# Altium footprint library Connectors.PcbLib: 135 footprints (part 2 of 9)
Each footprint in its own frame and in the unit in brackets; x right, y up, seen from the top. Pads: shape width x height; smd on the part's side, far side on the other; paste and mask are expansions set on the pad; w line width, h text height; cw(c..) or ccw(c..) is an arc to the next point about the centre after c.
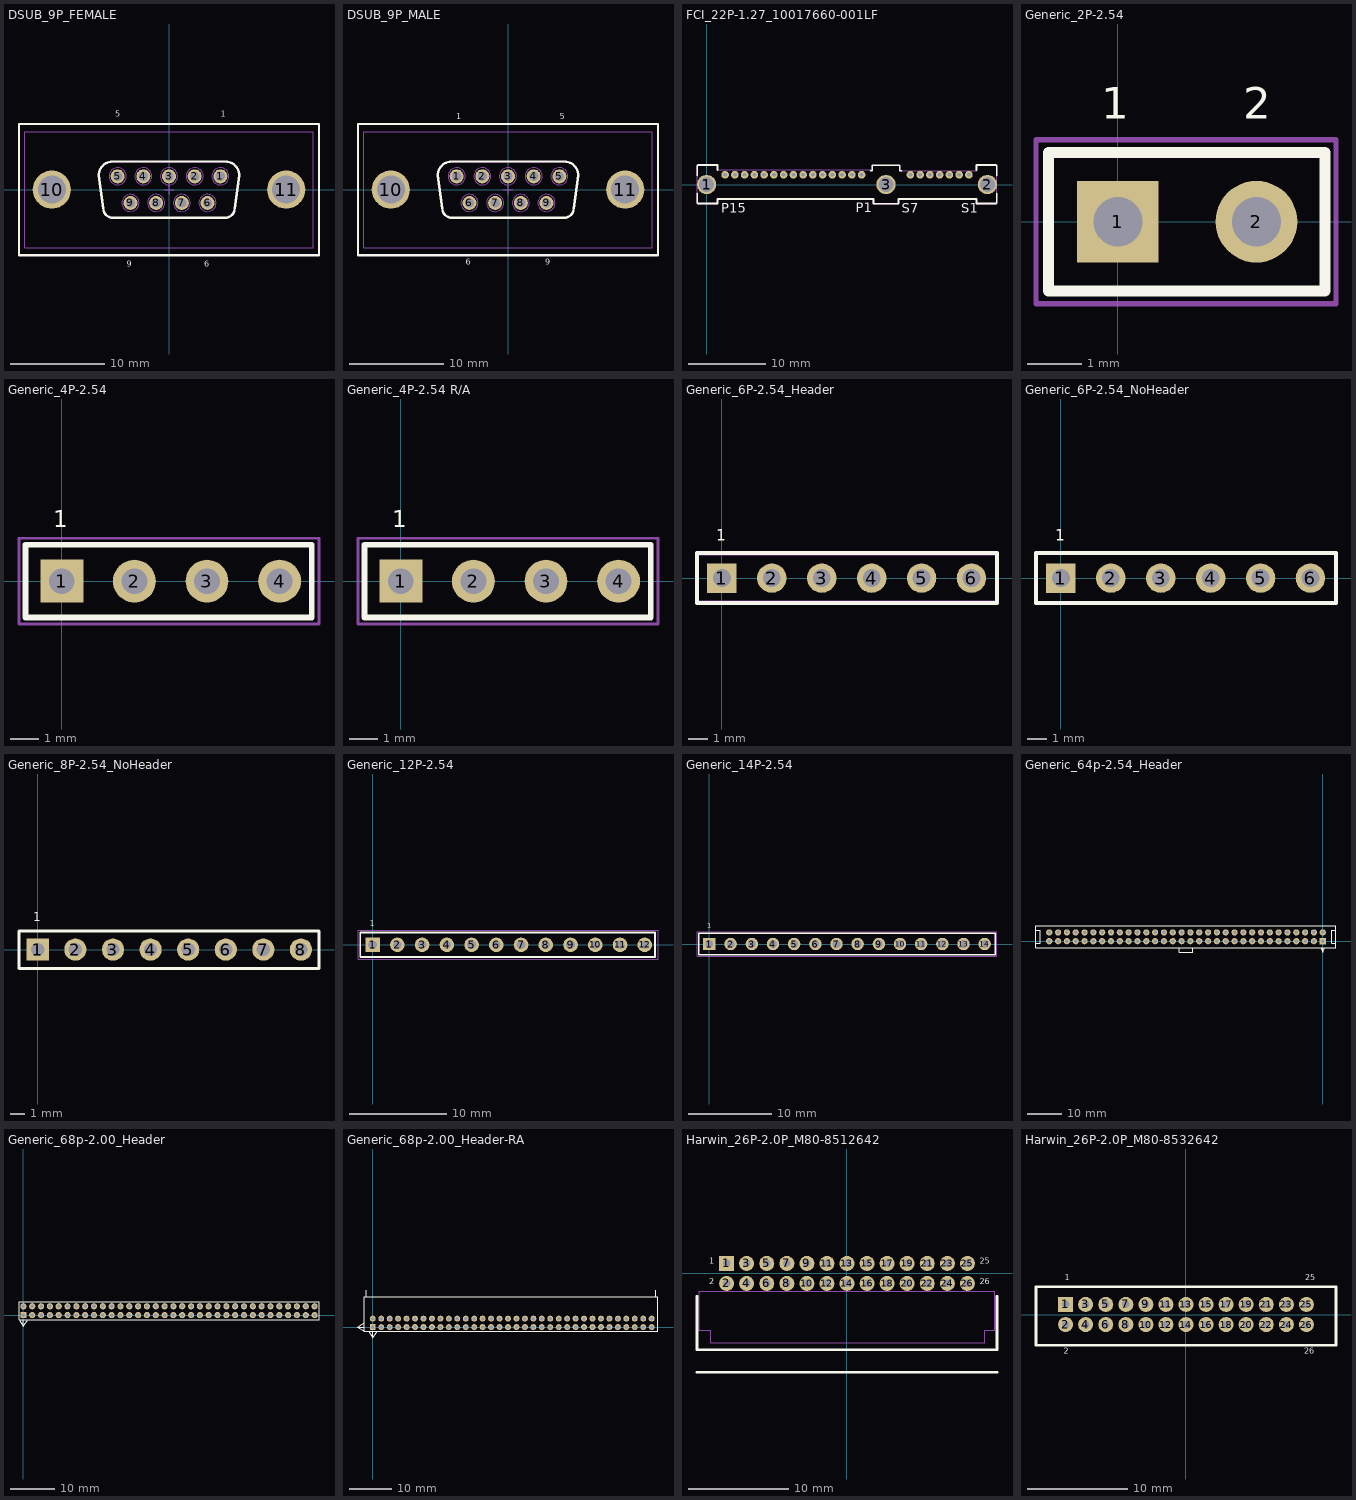
[diagram p1: the footprints below, top view; thin cyan lines are the x and y axes]

## DSUB_9P_FEMALE [mm] "D-SUB- 9P, FEMALE, STRAIGHT, TH"
height 12
pads (11):
  round 1.5 hole 1: 1(5.48,1.42) 2(2.74,1.42) 3(0,1.42) 4(-2.74,1.42) 5(-5.48,1.42) 6(4.11,-1.42) 7(1.37,-1.42) 8(-1.37,-1.42) 9(-4.11,-1.42)
  round 4.067 hole 3: 10(-12.5,0) 11(12.5,0)
Top Overlay:
  lines w0.254: -5.996,-3.004 cw(c-5.996,-2) -7,-2 -7.5,1.5 cw(c-6,1.5) -6,3 6,3 cw(c6,1.5) 7.5,1.5 7,-2 cw(c5.996,-2) 5.996,-3.004 ; -5.996,-3 6,-3 ; -16,-7 16,-7 16,7 -16,7 -16,0 -16,-7
  text "9" at -4.5,-8.25 h0.64
  text "6" at 3.75,-8.25 h0.64
  text "1" at 5.5,7.75 h0.64
  text "5" at -5.75,7.75 h0.64
Mechanical 1:
  circle w0.025: c12.5,0 r1.578
  circle w0.025: c-12.5,0 r1.578
  circle w0.025: c-5.48,1.42 r0.914
  circle w0.025: c-2.74,1.42 r0.914
  circle w0.025: c0,1.42 r0.914
  circle w0.025: c2.74,1.42 r0.914
  circle w0.025: c5.48,1.42 r0.914
  circle w0.025: c4.11,-1.42 r0.914
  circle w0.025: c1.37,-1.42 r0.914
  circle w0.025: c-1.37,-1.42 r0.914
  circle w0.025: c-4.11,-1.42 r0.914
  lines w0.025: -5.996,-3.004 cw(c-5.996,-2) -7,-2 -7.5,1.5 cw(c-6,1.5) -6,3 6,3 cw(c6,1.5) 7.5,1.5 7,-2 cw(c5.996,-2) 5.996,-3.004 ; -5.996,-3 6,-3 ; -15.4,-6.2 -15.4,6.2 15.4,6.2 15.4,-6.2 -15.4,-6.2
  text ".Designator" at -3.048,7.62 h1.52
Mechanical 15:
  lines w0.102: -0.5,0 0.5,0 ; 0,-0.5 0,0.5
3D body "210611003.stp": height 12.65, standoff -4.5, extent -15.4,-6.2 15.4,6.2

## DSUB_9P_MALE [mm] "D-SUB- 9P, MALE, STRAIGHT, TH"
height 12
pads (11):
  round 1.5 hole 1: 1(-5.48,1.42) 2(-2.74,1.42) 3(0,1.42) 4(2.74,1.42) 5(5.48,1.42) 6(-4.11,-1.42) 7(-1.37,-1.42) 8(1.37,-1.42) 9(4.11,-1.42)
  round 4.067 hole 3: 10(-12.5,0) 11(12.5,0)
Top Overlay:
  lines w0.254: -5.996,-3.004 cw(c-5.996,-2) -7,-2 -7.5,1.5 cw(c-6,1.5) -6,3 6,3 cw(c6,1.5) 7.5,1.5 7,-2 cw(c5.996,-2) 5.996,-3.004 ; -5.996,-3 6,-3 ; -16,-7 -16,0 -16,7 16,7 16,-7 -16,-7
  text "6" at -4.5,-8 h0.64
  text "9" at 4,-8 h0.64
  text "1" at -5.5,7.5 h0.64
  text "5" at 5.5,7.5 h0.64
Mechanical 1:
  circle w0.025: c-4.11,-1.42 r0.914
  circle w0.025: c-1.37,-1.42 r0.914
  circle w0.025: c1.37,-1.42 r0.914
  circle w0.025: c4.11,-1.42 r0.914
  circle w0.025: c5.48,1.42 r0.914
  circle w0.025: c2.74,1.42 r0.914
  circle w0.025: c0,1.42 r0.914
  circle w0.025: c-2.74,1.42 r0.914
  circle w0.025: c-5.48,1.42 r0.914
  circle w0.025: c-12.5,0 r1.578
  circle w0.025: c12.5,0 r1.578
  lines w0.025: -5.996,-3.004 cw(c-5.996,-2) -7,-2 -7.5,1.5 cw(c-6,1.5) -6,3 6,3 cw(c6,1.5) 7.5,1.5 7,-2 cw(c5.996,-2) 5.996,-3.004 ; -5.996,-3 6,-3 ; -15.4,-6.2 15.4,-6.2 15.4,6.2 -15.4,6.2 -15.4,-6.2
  text ".Designator" at -2.032,7.62 h1.52
Mechanical 15:
  lines w0.102: -0.5,0 0.5,0 ; 0,-0.5 0,0.5
3D body "210111003.stp": height 12.5, standoff -4.5, extent -15.4,-6.2 15.4,6.2

## FCI_22P-1.27_10017660-001LF [mm] "FCI_10017660-001LF"
pads (25):
  round 2.5 hole 1.95: 1(0,0) 2(36.57,0) 3(23.365,0)
  round 1 hole 0.5: p1(20.19,1.27) p2(18.92,1.27) p3(17.65,1.27) p4(16.38,1.27) p5(15.11,1.27) p6(13.84,1.27) p7(12.57,1.27) p8(11.3,1.27) p9(10.03,1.27) p10(8.76,1.27) p11(7.49,1.27) p12(6.22,1.27) p13(4.95,1.27) p14(3.68,1.27) p15(2.41,1.27) S1(34.16,1.27) S2(32.89,1.27) S3(31.62,1.27) S4(30.35,1.27) S5(29.08,1.27) S6(27.81,1.27) S7(26.54,1.27)
Top Overlay:
  lines w0.2: 21.333,1.778 21.587,1.778 21.587,2.54 25.143,2.54 25.143,1.778 25.433,1.778
  lines w0.25: -1.215,-2.43 -1.215,-1.13 ; -1.215,1.17 -1.215,2.47 ; -1.13,-2.48 1.44,-2.48 1.44,-1.905 21.714,-1.905 21.714,-2.5 22.182,-2.5 25.016,-2.5 25.016,-1.905 27.483,-1.905 35.13,-1.905 35.13,-2.48 37.7,-2.48 ; -1.13,2.52 1.44,2.52 1.44,1.905 ; 35.13,1.905 35.13,2.52 37.7,2.52 ; 37.785,-2.43 37.785,-1.13 ; 37.785,1.17 37.785,2.47
  text "P15" at 1.931,-3.651 h1.25
  text "P1" at 19.432,-3.601 h1.25
  text "S7" at 25.405,-3.699 h1.25
  text "S1" at 33.148,-3.677 h1.25
Mechanical 1:
  lines w0.127: -1.215,-2.48 1.44,-2.48 1.44,-1.905 21.714,-1.905 21.714,-2.5 25.016,-2.5 25.016,-1.905 35.179,-1.905 35.179,-2.48 37.785,-2.48 37.785,2.52 35.13,2.52 35.13,1.778 25.143,1.778 25.143,2.54 21.587,2.54 21.587,1.905 1.44,1.905 1.44,2.54 -1.215,2.54 -1.215,2.47 -1.215,-2.48
  text ".Designator" at 9.652,-1.27 h1.52
3D body "10017660-001c.step": height 9.86, standoff -2.94, extent -1.93,-2.5 38.5,2.5

## Generic_2P-2.54 [mm] "Connector; Header; 2 Position"
pads (2):
  rect 1.5x1.5 hole 0.9: 1(0,0)
  round 1.5 hole 0.9: 2(2.54,0)
Top Overlay:
  lines w0.2: -1.27,-1.27 3.8,-1.27 3.8,1.27 0.635,1.27 -1.27,1.27 -1.27,-1.27
  text "2" at 2.3,1.7 h1
  text "1" at -0.3,1.7 h1
Mechanical 1:
  lines w0.1: -1.5,-1.5 -1.5,1.5 4,1.5 4,-1.5 -1.5,-1.5
  text "2" at 2.3,1.7 h1
  text "1" at -0.3,1.7 h1
  text ".Designator" at -0.3,-2.3 h1

## Generic_4P-2.54 [mm] "Connector; Header; 4 Position"
pads (4):
  rect 1.5x1.5 hole 0.9: 1(0,0)
  round 1.5 hole 0.9: 2(2.54,0) 3(5.08,0) 4(7.62,0)
Top Overlay:
  lines w0.2: -1.27,-1.27 8.75,-1.27 8.75,1.27 0.635,1.27 -1.27,1.27 -1.27,-1.27
  text "1" at -0.3,1.7 h1
Mechanical 1:
  lines w0.1: -1.5,-1.5 -1.5,1.5 9,1.5 9,-1.5 -1.5,-1.5
  text "4" at 7.25,1.5 h1
  text "1" at -0.3,1.7 h1
  text ".Designator" at -0.5,-3 h1

## Generic_4P-2.54 R/A [mm] "Connector; Header; 4 Position"
pads (4):
  rect 1.5x1.5 hole 0.9: 1(0,0)
  round 1.5 hole 0.9: 2(2.54,0) 3(5.08,0) 4(7.62,0)
Top Overlay:
  lines w0.2: -1.27,-1.27 -1.27,1.27 0.635,1.27 8.75,1.27 8.75,-1.27 -1.27,-1.27
  text "1" at -0.3,1.7 h1
Mechanical 1:
  lines w0.1: -1.5,-1.5 9,-1.5 9,1.5 -1.5,1.5 -1.5,-1.5
  text ".Designator" at -0.5,-3 h1
  text "1" at -0.3,1.7 h1
  text "4" at 7.25,1.5 h1
3D body "DS1022-1x4RDF11.stp": height 2.54, standoff -3, extent -1.295,-10.001 8.865,0.349

## Generic_6P-2.54_Header [mm] "Connector; Header; 6 Position"
pads (6):
  rect 1.5x1.5 hole 0.9: 1(0,0)
  round 1.5 hole 0.9: 2(2.54,0) 3(5.08,0) 4(7.62,0) 5(10.16,0) 6(12.7,0)
Top Overlay:
  lines w0.2: -1.27,-1.27 -1.27,1.27 0.635,1.27 14,1.27 14,-1.27 -1.27,-1.27
  text "1" at -0.3,1.7 h1
Mechanical 1:
  circle w0.025: c12.7,0 r0.51
  circle w0.025: c10.16,0 r0.51
  circle w0.025: c7.62,0 r0.51
  circle w0.025: c5.08,0 r0.51
  circle w0.025: c2.54,0 r0.51
  circle w0.025: c0,0 r0.51
  lines w0.1: -1.27,-1.2 14,-1.2 14,1.2 -1.27,1.2 -1.27,-1.2
  text ".Designator" at 4.9,1.8 h1.02
  text "1" at -0.3,1.7 h0.51
  text "6" at 12.4,1.6 h0.51
3D body "901200126.stp": height 9.25, standoff -2.87, extent -1.27,-1.25 13.97,1.25

## Generic_6P-2.54_NoHeader [mm] "Connector; Header; 6 Position"
pads (6):
  rect 1.5x1.5 hole 0.9: 1(0,0)
  round 1.5 hole 0.9: 2(2.54,0) 3(5.08,0) 4(7.62,0) 5(10.16,0) 6(12.7,0)
Top Overlay:
  lines w0.2: -1.27,-1.27 -1.27,1.27 0.635,1.27 14,1.27 14,-1.27 -1.27,-1.27
  text "1" at -0.3,1.7 h1
Mechanical 1:
  circle w0.025: c12.7,0 r0.51
  circle w0.025: c10.16,0 r0.51
  circle w0.025: c7.62,0 r0.51
  circle w0.025: c5.08,0 r0.51
  circle w0.025: c2.54,0 r0.51
  circle w0.025: c0,0 r0.51
  text ".Designator" at 4.9,1.8 h1.02
  text "1" at -0.3,1.7 h0.51
  text "6" at 12.4,1.6 h0.51

## Generic_8P-2.54_NoHeader [mm] "Connector; Header; 8 Position"
pads (8):
  rect 1.5x1.5 hole 0.9: 1(0,0)
  round 1.5 hole 0.9: 2(2.54,0) 3(5.08,0) 4(7.62,0) 5(10.16,0) 6(12.7,0) 7(15.24,0) 8(17.78,0)
Top Overlay:
  lines w0.2: -1.27,-1.27 -1.27,1.27 0.635,1.27 19,1.27 19,-1.27 -1.27,-1.27
  text "1" at -0.3,1.7 h1
Mechanical 1:
  circle w0.025: c12.7,0 r0.51
  circle w0.025: c10.16,0 r0.51
  circle w0.025: c7.62,0 r0.51
  circle w0.025: c5.08,0 r0.51
  circle w0.025: c2.54,0 r0.51
  circle w0.025: c0,0 r0.51
  text ".Designator" at 4.9,1.8 h1.02
  text "1" at -0.3,1.7 h0.51
  text "8" at 17.6,1.6 h0.51

## Generic_12P-2.54 [mm] "Connector; Header; 12 Position"
pads (12):
  rect 1.5x1.5 hole 0.9: 1(0,0)
  round 1.5 hole 0.9: 2(2.54,0) 3(5.08,0) 4(7.62,0) 5(10.16,0) 6(12.7,0) 7(15.24,0) 8(17.78,0) 9(20.32,0) 10(22.86,0) 11(25.4,0) 12(27.94,0)
Top Overlay:
  lines w0.2: -1.27,-1.27 29,-1.27 29,1.27 0.635,1.27 -1.27,1.27 -1.27,-1.27
  text "1" at -0.3,1.7 h1
Mechanical 1:
  lines w0.1: -1.5,-1.5 -1.5,1.5 29.3,1.5 29.3,-1.5 -1.5,-1.5
  text "12" at 27.1,1.7 h1
  text "1" at -0.3,1.7 h1
  text ".Designator" at -0.5,-3 h1

## Generic_14P-2.54 [mm] "Connector; Header; 14 Position"
pads (14):
  rect 1.5x1.5 hole 0.9: 1(0,0)
  round 1.5 hole 0.9: 2(2.54,0) 3(5.08,0) 4(7.62,0) 5(10.16,0) 6(12.7,0) 7(15.24,0) 8(17.78,0) 9(20.32,0) 10(22.86,0) 11(25.4,0) 12(27.94,0) 13(30.48,0) 14(33.02,0)
Top Overlay:
  lines w0.2: -1.27,-1.27 -1.27,1.27 0.635,1.27 34.29,1.27 34.29,-1.27 -1.27,-1.27
  text "1" at -0.3,1.7 h1
Mechanical 1:
  lines w0.1: -1.5,-1.5 34.5,-1.5 34.5,1.5 -1.5,1.5 -1.5,-1.5
  text ".Designator" at -0.5,-3 h1
  text "1" at -0.3,1.7 h1
  text "14" at 32.3,1.7 h1

## Generic_64p-2.54_Header [mm]
pads (64):
  rect 1.8x1.8 hole 1: 1(0,0)
  round 1.8 hole 1: 2(0,2.54) 3(-2.54,0) 4(-2.54,2.54) 5(-5.08,0) 6(-5.08,2.54) 7(-7.62,0) 8(-7.62,2.54) 9(-10.16,0) 10(-10.16,2.54) 11(-12.7,0) 12(-12.7,2.54) 13(-15.24,0) 14(-15.24,2.54) 15(-17.78,0) 16(-17.78,2.54) 17(-20.32,0) 18(-20.32,2.54) 19(-22.86,0) 20(-22.86,2.54) 21(-25.4,0) 22(-25.4,2.54) 23(-27.94,0) 24(-27.94,2.54) 25(-30.48,0) 26(-30.48,2.54) 27(-33.02,0) 28(-33.02,2.54) 29(-35.56,0) 30(-35.56,2.54) 31(-38.1,0) 32(-38.1,2.54) 33(-40.64,0) 34(-40.64,2.54) 35(-43.18,0) 36(-43.18,2.54) 37(-45.72,0) 38(-45.72,2.54) 39(-48.26,0) 40(-48.26,2.54) 41(-50.8,0) 42(-50.8,2.54) 43(-53.34,0) 44(-53.34,2.54) 45(-55.88,0) 46(-55.88,2.54) 47(-58.42,0) 48(-58.42,2.54) 49(-60.96,0) 50(-60.96,2.54) 51(-63.5,0) 52(-63.5,2.54) 53(-66.04,0) 54(-66.04,2.54) 55(-68.58,0) 56(-68.58,2.54) 57(-71.12,0) 58(-71.12,2.54) 59(-73.66,0) 60(-73.66,2.54) 61(-76.2,0) 62(-76.2,2.54) 63(-78.74,0) 64(-78.74,2.54)
Top Overlay:
  lines w0.127: -82.55,-0.635 -81.28,-0.635 -81.28,3.175 -82.55,3.175 ; -41.275,-1.905 -41.275,-3.175 -37.465,-3.175 -37.465,-1.905 ; -0.635,-1.905 0,-3.175 ; 0,-1.905 0,-3.175 ; 0.635,-1.905 0,-3.175 ; 3.81,-0.635 2.54,-0.635 2.54,3.175 3.81,3.175 ; -82.55,-1.905 3.81,-1.905 3.81,4.445 -82.55,4.445 -82.55,-1.905

## Generic_68p-2.00_Header [mm]
pads (68):
  rect 1.4x1.4 hole 0.8: 1(0,0)
  round 1.4 hole 0.8: 2(0,2) 3(2,0) 4(2,2) 5(4,0) 6(4,2) 7(6,0) 8(6,2) 9(8,0) 10(8,2) 11(10,0) 12(10,2) 13(12,0) 14(12,2) 15(14,0) 16(14,2) 17(16,0) 18(16,2) 19(18,0) 20(18,2) 21(20,0) 22(20,2) 23(22,0) 24(22,2) 25(24,0) 26(24,2) 27(26,0) 28(26,2) 29(28,0) 30(28,2) 31(30,0) 32(30,2) 33(32,0) 34(32,2) 35(34,0) 36(34,2) 37(36,0) 38(36,2) 39(38,0) 40(38,2) 41(40,0) 42(40,2) 43(42,0) 44(42,2) 45(44,0) 46(44,2) 47(46,0) 48(46,2) 49(48,0) 50(48,2) 51(50,0) 52(50,2) 53(52,0) 54(52,2) 55(54,0) 56(54,2) 57(56,0) 58(56,2) 59(58,0) 60(58,2) 61(60,0) 62(60,2) 63(62,0) 64(62,2) 65(64,0) 66(64,2) 67(66,0) 68(66,2)
Top Overlay:
  lines w0.127: 0,-1 0,-2.5 ; 1,-1 0,-2.5 ; -1,-1 67,-1 67,3 -1,3 -1,1 -1,-1 ; -1,-1 0,-2.5

## Generic_68p-2.00_Header-RA [mm]
pads (68):
  rect 1.4x1.4 hole 0.8: 1(0,0)
  round 1.4 hole 0.8: 2(0,2) 3(2,0) 4(2,2) 5(4,0) 6(4,2) 7(6,0) 8(6,2) 9(8,0) 10(8,2) 11(10,0) 12(10,2) 13(12,0) 14(12,2) 15(14,0) 16(14,2) 17(16,0) 18(16,2) 19(18,0) 20(18,2) 21(20,0) 22(20,2) 23(22,0) 24(22,2) 25(24,0) 26(24,2) 27(26,0) 28(26,2) 29(28,0) 30(28,2) 31(30,0) 32(30,2) 33(32,0) 34(32,2) 35(34,0) 36(34,2) 37(36,0) 38(36,2) 39(38,0) 40(38,2) 41(40,0) 42(40,2) 43(42,0) 44(42,2) 45(44,0) 46(44,2) 47(46,0) 48(46,2) 49(48,0) 50(48,2) 51(50,0) 52(50,2) 53(52,0) 54(52,2) 55(54,0) 56(54,2) 57(56,0) 58(56,2) 59(58,0) 60(58,2) 61(60,0) 62(60,2) 63(62,0) 64(62,2) 65(64,0) 66(64,2) 67(66,0) 68(66,2)
Top Overlay:
  lines w0.127: -2,0 -3.5,0 ; -2,1 -3.5,0 ; -1.5,7.2 -1.5,8.7 ; -1,-1 0,-2.5 ; 0,-1 0,-2.5 ; 1,-1 0,-2.5 ; 67,7.2 67,8.7 ; -3.5,0 -2,-1 ; -2,-1 67.5,-1 67.5,7.2 -2,7.2 -2,-1

## Harwin_26P-2.0P_M80-8512642 [mm] "Connector Header 26pos 2.0mm TH RA"
pads (26):
  rect 1.5x1.5 hole 0.75: 1(-12,1)
  round 1.5 hole 0.75: 2(-12,-1) 3(-10,1) 4(-10,-1) 5(-8,1) 6(-8,-1) 7(-6,1) 8(-6,-1) 9(-4,1) 10(-4,-1) 11(-2,1) 12(-2,-1) 13(0,1) 14(0,-1) 15(2,1) 16(2,-1) 17(4,1) 18(4,-1) 19(6,1) 20(6,-1) 21(8,1) 22(8,-1) 23(10,1) 24(10,-1) 25(12,1) 26(12,-1)
Top Overlay:
  lines w0.254: -14.95,-9.85 14.95,-9.85 ; -14.95,-2.286 -14.95,-7.62 14.95,-7.62 14.95,-2.286
  text "2" at -13.716,-1.27 h1
  text "26" at 13.208,-1.27 h1
  text "25" at 13.208,0.762 h1
  text "1" at -13.716,0.762 h1
Mechanical 1:
  circle w0.025: c12,-1 r0.3
  circle w0.025: c12,1 r0.3
  circle w0.025: c10,1 r0.3
  circle w0.025: c10,-1 r0.3
  circle w0.025: c8,-1 r0.3
  circle w0.025: c8,1 r0.3
  circle w0.025: c6,1 r0.3
  circle w0.025: c6,-1 r0.3
  circle w0.025: c4,-1 r0.3
  circle w0.025: c4,1 r0.3
  circle w0.025: c2,-1 r0.3
  circle w0.025: c2,1 r0.3
  circle w0.025: c0,-1 r0.3
  circle w0.025: c0,1 r0.3
  circle w0.025: c-2,-1 r0.3
  circle w0.025: c-2,1 r0.3
  circle w0.025: c-4,-1 r0.3
  circle w0.025: c-4,1 r0.3
  circle w0.025: c-6,-1 r0.3
  circle w0.025: c-6,1 r0.3
  circle w0.025: c-8,-1 r0.3
  circle w0.025: c-8,1 r0.3
  circle w0.025: c-10,-1 r0.3
  circle w0.025: c-12,-1 r0.3
  circle w0.025: c-10,1 r0.3
  circle w0.025: c-12,1 r0.3
  lines w0.025: -14.75,-5.65 -13.601,-5.65 -13.601,-6.9 13.75,-6.9 13.75,-5.664 14.75,-5.664 14.75,-1.8 -14.75,-1.8 -14.75,-5.65
  text "25" at 11.6,1.8 h1
  text "1" at -12.1,1.9 h1
  text ".Designator" at -5.156,-4.521 h1.52
3D body "m80-8512642_asm.stp": height 5.83, standoff -3.22, extent -14.95,-9.85 14.95,1.25

## Harwin_26P-2.0P_M80-8532642 [mm] "Connector Header 26pos 2.0mm TH"
pads (26):
  rect 1.5x1.5 hole 0.75: 1(-12,1)
  round 1.5 hole 0.75: 2(-12,-1) 3(-10,1) 4(-10,-1) 5(-8,1) 6(-8,-1) 7(-6,1) 8(-6,-1) 9(-4,1) 10(-4,-1) 11(-2,1) 12(-2,-1) 13(0,1) 14(0,-1) 15(2,1) 16(2,-1) 17(4,1) 18(4,-1) 19(6,1) 20(6,-1) 21(8,1) 22(8,-1) 23(10,1) 24(10,-1) 25(12,1) 26(12,-1)
Top Overlay:
  lines w0.254: -14.95,-3.075 14.95,-3.075 14.95,2.775 -14.95,2.775 -14.95,-3.075
  text "1" at -12.1,3.2 h1
  text "25" at 11.9,3.2 h1
  text "26" at 11.8,-4.1 h1
  text "2" at -12.2,-4.1 h1
Mechanical 1:
  circle w0.025: c-12,1 r0.3
  circle w0.025: c-10,1 r0.3
  circle w0.025: c-12,-1 r0.3
  circle w0.025: c-10,-1 r0.3
  circle w0.025: c-8,1 r0.3
  circle w0.025: c-8,-1 r0.3
  circle w0.025: c-6,1 r0.3
  circle w0.025: c-6,-1 r0.3
  circle w0.025: c-4,1 r0.3
  circle w0.025: c-4,-1 r0.3
  circle w0.025: c-2,1 r0.3
  circle w0.025: c-2,-1 r0.3
  circle w0.025: c0,1 r0.3
  circle w0.025: c0,-1 r0.3
  circle w0.025: c2,1 r0.3
  circle w0.025: c2,-1 r0.3
  circle w0.025: c4,1 r0.3
  circle w0.025: c4,-1 r0.3
  circle w0.025: c6,-1 r0.3
  circle w0.025: c6,1 r0.3
  circle w0.025: c8,1 r0.3
  circle w0.025: c8,-1 r0.3
  circle w0.025: c10,-1 r0.3
  circle w0.025: c10,1 r0.3
  circle w0.025: c12,1 r0.3
  circle w0.025: c12,-1 r0.3
  lines w0.025: -14.95,-3.075 -14.95,2.775 14.95,2.775 14.95,-3.075 -14.95,-3.075
  text ".Designator" at -4.68,3.3 h1.52
  text "1" at -12.1,1.9 h1
  text "25" at 11.6,1.8 h1
3D body "m80-8532642_asm.stp": height 8.05, standoff -3.65, extent -14.95,-3.075 14.95,2.775